# Altium schematic symbol library jlcpcb_2025_04_inductors_extended_0805.schlib: 882 symbols (part 3 of 5)
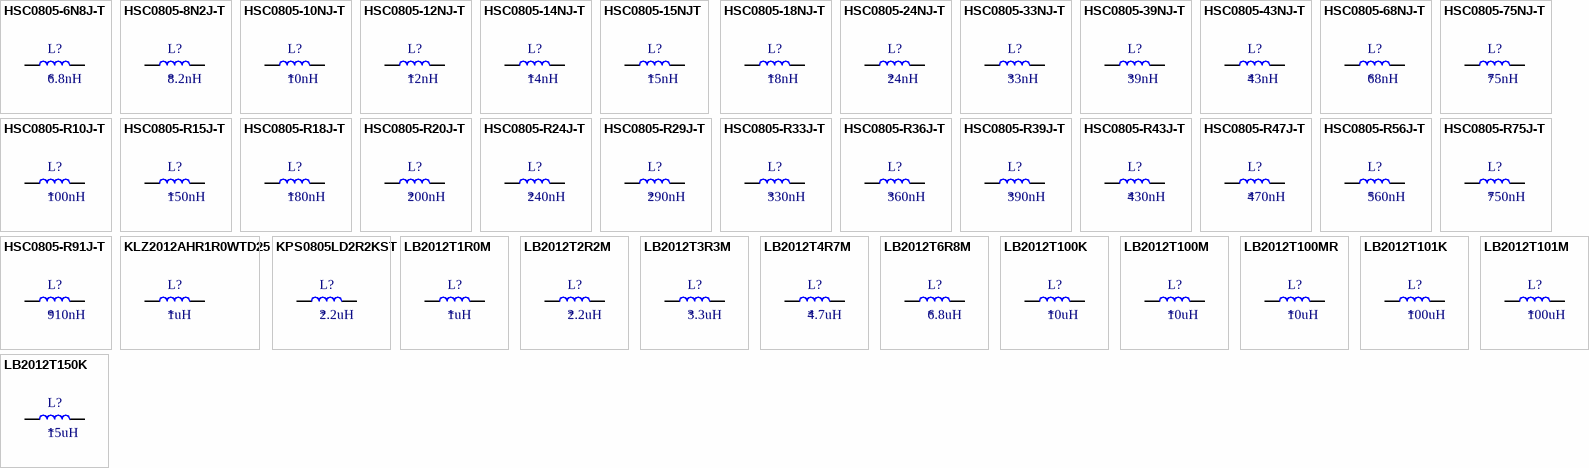
[diagram p24: symbols HSC0805-6N8J-T to LB2012T150K]

## HSC0805-R18J-T
designator L?  Inductance: 180nH
Inductor, 180nH, ±5%, 640mΩ, 400mA, SMD 0805; Manufacturer: EMTEK; Manufacturer Part Number: HSC0805-R18J-T; Self-Resonant Frequency: 870MHz; Q Factor: 50@250MHz; Package Size: 0805; JLCPCB Basic Part: No; JLCPCB Part Number: C251836; Supplier 1: LCSC; Category: Inductors; Supplier Part Number 1: C251836; Tolerance: ±5%; Rated Current: 400mA; DC Resistance: 640mΩ; RoHS: Yes; ComponentLink1Description: Datasheet; ComponentLink1URL: https://wmsc.lcsc.com/wmsc/upload/file/pdf/v2/lcsc/2304140030_EMTEK-HSC0805-R18J-T_C251836.pdf; ComponentLink2Description: JLCPCB Part URL; ComponentLink2URL: https://jlcpcb.com/partdetail/C251836; ComponentLink3Description: LCSC Part URL; ComponentLink3URL: https://lcsc.com/product-detail/Inductors-SMD_EMTEK-EMTEK-HSC0805-R18J-T_C251836.html
footprint IND-0805 (0805 (2012M) Inductor)
pins: 1, 2

## HSC0805-R20J-T
designator L?  Inductance: 200nH
Inductor, 200nH, ±5%, 680mΩ, 400mA, SMD 0805; Manufacturer: EMTEK; Manufacturer Part Number: HSC0805-R20J-T; Self-Resonant Frequency: 865MHz; Q Factor: 50@250MHz; Package Size: 0805; JLCPCB Basic Part: No; JLCPCB Part Number: C251838; Supplier 1: LCSC; Category: Inductors; Supplier Part Number 1: C251838; Tolerance: ±5%; Rated Current: 400mA; DC Resistance: 680mΩ; RoHS: Yes; ComponentLink1Description: Datasheet; ComponentLink1URL: https://wmsc.lcsc.com/wmsc/upload/file/pdf/v2/lcsc/2304140030_EMTEK-HSC0805-R20J-T_C251838.pdf; ComponentLink2Description: JLCPCB Part URL; ComponentLink2URL: https://jlcpcb.com/partdetail/C251838; ComponentLink3Description: LCSC Part URL; ComponentLink3URL: https://lcsc.com/product-detail/Inductors-SMD_EMTEK-EMTEK-HSC0805-R20J-T_C251838.html
footprint IND-0805 (0805 (2012M) Inductor)
pins: 1, 2

## HSC0805-R24J-T
designator L?  Inductance: 240nH
Inductor, 240nH, ±5%, 1Ω, 350mA, SMD 0805; Manufacturer: EMTEK; Manufacturer Part Number: HSC0805-R24J-T; Self-Resonant Frequency: 690MHz; Q Factor: 44@250MHz; Package Size: 0805; JLCPCB Basic Part: No; JLCPCB Part Number: C251864; Supplier 1: LCSC; Category: Inductors; Supplier Part Number 1: C251864; Tolerance: ±5%; Rated Current: 350mA; DC Resistance: 1Ω; RoHS: Yes; ComponentLink1Description: Datasheet; ComponentLink1URL: https://wmsc.lcsc.com/wmsc/upload/file/pdf/v2/lcsc/2304140030_EMTEK-HSC0805-R24J-T_C251864.pdf; ComponentLink2Description: JLCPCB Part URL; ComponentLink2URL: https://jlcpcb.com/partdetail/C251864; ComponentLink3Description: LCSC Part URL; ComponentLink3URL: https://lcsc.com/product-detail/Inductors-SMD_EMTEK-EMTEK-HSC0805-R24J-T_C251864.html
footprint IND-0805 (0805 (2012M) Inductor)
pins: 1, 2

## HSC0805-R29J-T
designator L?  Inductance: 290nH
Inductor, 290nH, ±5%, SMD 0805; Manufacturer: EMTEK; Manufacturer Part Number: HSC0805-R29J-T; Package Size: 0805; JLCPCB Basic Part: No; JLCPCB Part Number: C691872; Supplier 1: LCSC; Category: Inductors; Supplier Part Number 1: C691872; Tolerance: ±5%; RoHS: Yes; ComponentLink1Description: Datasheet; ComponentLink2Description: JLCPCB Part URL; ComponentLink2URL: https://jlcpcb.com/partdetail/C691872; ComponentLink3Description: LCSC Part URL; ComponentLink3URL: https://lcsc.com/product-detail/Inductors-SMD_EMTEK-EMTEK-HSC0805-R29J-T_C691872.html
footprint IND-0805 (0805 (2012M) Inductor)
pins: 1, 2

## HSC0805-R33J-T
designator L?  Inductance: 330nH
Inductor, 330nH, ±5%, 1.4Ω, 310mA, SMD 0805; Manufacturer: EMTEK; Manufacturer Part Number: HSC0805-R33J-T; Self-Resonant Frequency: 750MHz; Q Factor: 48@250MHz; Package Size: 0805; JLCPCB Basic Part: No; JLCPCB Part Number: C251840; Supplier 1: LCSC; Category: Inductors; Supplier Part Number 1: C251840; Tolerance: ±5%; Rated Current: 310mA; DC Resistance: 1.4Ω; RoHS: Yes; ComponentLink1Description: Datasheet; ComponentLink1URL: https://wmsc.lcsc.com/wmsc/upload/file/pdf/v2/lcsc/2304140030_EMTEK-HSC0805-R33J-T_C251840.pdf; ComponentLink2Description: JLCPCB Part URL; ComponentLink2URL: https://jlcpcb.com/partdetail/C251840; ComponentLink3Description: LCSC Part URL; ComponentLink3URL: https://lcsc.com/product-detail/Inductors-SMD_EMTEK-EMTEK-HSC0805-R33J-T_C251840.html
footprint IND-0805 (0805 (2012M) Inductor)
pins: 1, 2

## HSC0805-R36J-T
designator L?  Inductance: 360nH
Inductor, 360nH, ±5%, 1.45Ω, 300mA, SMD 0805; Manufacturer: EMTEK; Manufacturer Part Number: HSC0805-R36J-T; Self-Resonant Frequency: 650MHz; Q Factor: 48@250MHz; Package Size: 0805; JLCPCB Basic Part: No; JLCPCB Part Number: C251841; Supplier 1: LCSC; Category: Inductors; Supplier Part Number 1: C251841; Tolerance: ±5%; Rated Current: 300mA; DC Resistance: 1.45Ω; RoHS: Yes; ComponentLink1Description: Datasheet; ComponentLink1URL: https://wmsc.lcsc.com/wmsc/upload/file/pdf/v2/lcsc/2304140030_EMTEK-HSC0805-R36J-T_C251841.pdf; ComponentLink2Description: JLCPCB Part URL; ComponentLink2URL: https://jlcpcb.com/partdetail/C251841; ComponentLink3Description: LCSC Part URL; ComponentLink3URL: https://lcsc.com/product-detail/Inductors-SMD_EMTEK-EMTEK-HSC0805-R36J-T_C251841.html
footprint IND-0805 (0805 (2012M) Inductor)
pins: 1, 2

## HSC0805-R39J-T
designator L?  Inductance: 390nH
Inductor, 390nH, ±5%, 1.5Ω, 290mA, SMD 0805; Manufacturer: EMTEK; Manufacturer Part Number: HSC0805-R39J-T; Self-Resonant Frequency: 560MHz; Q Factor: 48@250MHz; Package Size: 0805; JLCPCB Basic Part: No; JLCPCB Part Number: C251842; Supplier 1: LCSC; Category: Inductors; Supplier Part Number 1: C251842; Tolerance: ±5%; Rated Current: 290mA; DC Resistance: 1.5Ω; RoHS: Yes; ComponentLink1Description: Datasheet; ComponentLink1URL: https://wmsc.lcsc.com/wmsc/upload/file/pdf/v2/lcsc/2304140030_EMTEK-HSC0805-R39J-T_C251842.pdf; ComponentLink2Description: JLCPCB Part URL; ComponentLink2URL: https://jlcpcb.com/partdetail/C251842; ComponentLink3Description: LCSC Part URL; ComponentLink3URL: https://lcsc.com/product-detail/Inductors-SMD_EMTEK-EMTEK-HSC0805-R39J-T_C251842.html
footprint IND-0805 (0805 (2012M) Inductor)
pins: 1, 2

## HSC0805-R43J-T
designator L?  Inductance: 430nH
Inductor, 430nH, ±5%, 1.7Ω, 270mA, SMD 0805; Manufacturer: EMTEK; Manufacturer Part Number: HSC0805-R43J-T; Self-Resonant Frequency: 430MHz; Q Factor: 33@100MHz; Package Size: 0805; JLCPCB Basic Part: No; JLCPCB Part Number: C251843; Supplier 1: LCSC; Category: Inductors; Supplier Part Number 1: C251843; Tolerance: ±5%; Rated Current: 270mA; DC Resistance: 1.7Ω; RoHS: Yes; ComponentLink1Description: Datasheet; ComponentLink1URL: https://wmsc.lcsc.com/wmsc/upload/file/pdf/v2/lcsc/2304140030_EMTEK-HSC0805-R43J-T_C251843.pdf; ComponentLink2Description: JLCPCB Part URL; ComponentLink2URL: https://jlcpcb.com/partdetail/C251843; ComponentLink3Description: LCSC Part URL; ComponentLink3URL: https://lcsc.com/product-detail/Inductors-SMD_EMTEK-EMTEK-HSC0805-R43J-T_C251843.html
footprint IND-0805 (0805 (2012M) Inductor)
pins: 1, 2

## HSC0805-R47J-T
designator L?  Inductance: 470nH
Inductor, 470nH, ±5%, 1.76Ω, 250mA, SMD 0805; Manufacturer: EMTEK; Manufacturer Part Number: HSC0805-R47J-T; Self-Resonant Frequency: 375MHz; Q Factor: 30@100MHz; Package Size: 0805; JLCPCB Basic Part: No; JLCPCB Part Number: C251844; Supplier 1: LCSC; Category: Inductors; Supplier Part Number 1: C251844; Tolerance: ±5%; Rated Current: 250mA; DC Resistance: 1.76Ω; RoHS: Yes; ComponentLink1Description: Datasheet; ComponentLink1URL: https://wmsc.lcsc.com/wmsc/upload/file/pdf/v2/lcsc/2304140030_EMTEK-HSC0805-R47J-T_C251844.pdf; ComponentLink2Description: JLCPCB Part URL; ComponentLink2URL: https://jlcpcb.com/partdetail/C251844; ComponentLink3Description: LCSC Part URL; ComponentLink3URL: https://lcsc.com/product-detail/Inductors-SMD_EMTEK-EMTEK-HSC0805-R47J-T_C251844.html
footprint IND-0805 (0805 (2012M) Inductor)
pins: 1, 2

## HSC0805-R56J-T
designator L?  Inductance: 560nH
Inductor, 560nH, ±5%, 1.9Ω, 230mA, SMD 0805; Manufacturer: EMTEK; Manufacturer Part Number: HSC0805-R56J-T; Self-Resonant Frequency: 340MHz; Q Factor: 23@50MHz; Package Size: 0805; JLCPCB Basic Part: No; JLCPCB Part Number: C251845; Supplier 1: LCSC; Category: Inductors; Supplier Part Number 1: C251845; Tolerance: ±5%; Rated Current: 230mA; DC Resistance: 1.9Ω; RoHS: Yes; ComponentLink1Description: Datasheet; ComponentLink1URL: https://wmsc.lcsc.com/wmsc/upload/file/pdf/v2/lcsc/2304140030_EMTEK-HSC0805-R56J-T_C251845.pdf; ComponentLink2Description: JLCPCB Part URL; ComponentLink2URL: https://jlcpcb.com/partdetail/C251845; ComponentLink3Description: LCSC Part URL; ComponentLink3URL: https://lcsc.com/product-detail/Inductors-SMD_EMTEK-EMTEK-HSC0805-R56J-T_C251845.html
footprint IND-0805 (0805 (2012M) Inductor)
pins: 1, 2

## HSC0805-R75J-T
designator L?  Inductance: 750nH
Inductor, 750nH, ±5%, 2.3Ω, 180mA, SMD 0805; Manufacturer: EMTEK; Manufacturer Part Number: HSC0805-R75J-T; Self-Resonant Frequency: 200MHz; Q Factor: 23@50MHz; Package Size: 0805; JLCPCB Basic Part: No; JLCPCB Part Number: C251847; Supplier 1: LCSC; Category: Inductors; Supplier Part Number 1: C251847; Tolerance: ±5%; Rated Current: 180mA; DC Resistance: 2.3Ω; RoHS: Yes; ComponentLink1Description: Datasheet; ComponentLink1URL: https://wmsc.lcsc.com/wmsc/upload/file/pdf/v2/lcsc/2304140030_EMTEK-HSC0805-R75J-T_C251847.pdf; ComponentLink2Description: JLCPCB Part URL; ComponentLink2URL: https://jlcpcb.com/partdetail/C251847; ComponentLink3Description: LCSC Part URL; ComponentLink3URL: https://lcsc.com/product-detail/Inductors-SMD_EMTEK-EMTEK-HSC0805-R75J-T_C251847.html
footprint IND-0805 (0805 (2012M) Inductor)
pins: 1, 2

## HSC0805-R91J-T
designator L?  Inductance: 910nH
Inductor, 910nH, ±5%, 2.4Ω, 180mA, SMD 0805; Manufacturer: EMTEK; Manufacturer Part Number: HSC0805-R91J-T; Self-Resonant Frequency: 210MHz; Q Factor: 22@50MHz; Package Size: 0805; JLCPCB Basic Part: No; JLCPCB Part Number: C251861; Supplier 1: LCSC; Category: Inductors; Supplier Part Number 1: C251861; Tolerance: ±5%; Rated Current: 180mA; DC Resistance: 2.4Ω; RoHS: Yes; ComponentLink1Description: Datasheet; ComponentLink1URL: https://wmsc.lcsc.com/wmsc/upload/file/pdf/v2/lcsc/2304140030_EMTEK-HSC0805-R91J-T_C251861.pdf; ComponentLink2Description: JLCPCB Part URL; ComponentLink2URL: https://jlcpcb.com/partdetail/C251861; ComponentLink3Description: LCSC Part URL; ComponentLink3URL: https://lcsc.com/product-detail/Inductors-SMD_EMTEK-EMTEK-HSC0805-R91J-T_C251861.html
footprint IND-0805 (0805 (2012M) Inductor)
pins: 1, 2

## KLZ2012AHR1R0WTD25
designator L?  Inductance: 1uH
Inductor, 1uH, ±20%, 100mΩ, 280mA, SMD 0805; Manufacturer: TDK; Manufacturer Part Number: KLZ2012AHR1R0WTD25; Package Size: 0805; JLCPCB Basic Part: No; JLCPCB Part Number: C404389; Supplier 1: LCSC; Category: Inductors; Supplier Part Number 1: C404389; Tolerance: ±20%; Rated Current: 280mA; Saturation Current: 280mA; DC Resistance: 100mΩ; RoHS: Yes; ComponentLink1Description: Datasheet; ComponentLink1URL: https://wmsc.lcsc.com/wmsc/upload/file/pdf/v2/lcsc/2304140030_TDK-KLZ2012AHR1R0WTD25_C404389.pdf; ComponentLink2Description: JLCPCB Part URL; ComponentLink2URL: https://jlcpcb.com/partdetail/C404389; ComponentLink3Description: LCSC Part URL; ComponentLink3URL: https://lcsc.com/product-detail/Inductors-SMD_TDK-TDK-KLZ2012AHR1R0WTD25_C404389.html
footprint IND-0805 (0805 (2012M) Inductor)
pins: 1, 2

## KPS0805LD2R2KST
designator L?  Inductance: 2.2uH
Inductor, 2.2uH, ±10%, 310mΩ, 740mA, SMD 0805; Manufacturer: Yanchuang; Manufacturer Part Number: KPS0805LD2R2KST; Package Size: 0805; JLCPCB Basic Part: No; JLCPCB Part Number: C494719; Supplier 1: LCSC; Category: Inductors; Supplier Part Number 1: C494719; Tolerance: ±10%; Rated Current: 740mA; DC Resistance: 310mΩ; RoHS: Yes; ComponentLink1Description: Datasheet; ComponentLink1URL: https://wmsc.lcsc.com/wmsc/upload/file/pdf/v2/lcsc/2004071209_Yanchuang-KPS0805LD2R2KST_C494719.pdf; ComponentLink2Description: JLCPCB Part URL; ComponentLink2URL: https://jlcpcb.com/partdetail/C494719; ComponentLink3Description: LCSC Part URL; ComponentLink3URL: https://lcsc.com/product-detail/Inductors-SMD_Yanchuang-Yanchuang-KPS0805LD2R2KST_C494719.html
footprint IND-0805 (0805 (2012M) Inductor)
pins: 1, 2

## LB2012T1R0M
designator L?  Inductance: 1uH
Inductor, 1uH, ±20%, 195mΩ, 405mA, SMD 0805; Manufacturer: Taiyo Yuden; Manufacturer Part Number: LB2012T1R0M; Self-Resonant Frequency: 100MHz; Package Size: 0805; JLCPCB Basic Part: No; JLCPCB Part Number: C90322; Supplier 1: LCSC; Category: Inductors; Supplier Part Number 1: C90322; Tolerance: ±20%; Rated Current: 405mA; DC Resistance: 195mΩ; RoHS: Yes; ComponentLink1Description: Datasheet; ComponentLink1URL: https://wmsc.lcsc.com/wmsc/upload/file/pdf/v2/lcsc/2304140030_Taiyo-Yuden-LB2012T1R0M_C90322.pdf; ComponentLink2Description: JLCPCB Part URL; ComponentLink2URL: https://jlcpcb.com/partdetail/C90322; ComponentLink3Description: LCSC Part URL; ComponentLink3URL: https://lcsc.com/product-detail/Inductors-SMD_Taiyo-Yuden-Taiyo-Yuden-LB2012T1R0M_C90322.html
footprint IND-0805 (0805 (2012M) Inductor)
pins: 1, 2

## LB2012T2R2M
designator L?  Inductance: 2.2uH
Inductor, 2.2uH, ±20%, 230mΩ, 260mA, SMD 0805; Manufacturer: Taiyo Yuden; Manufacturer Part Number: LB2012T2R2M; Self-Resonant Frequency: 7.96MHz; Package Size: 0805; JLCPCB Basic Part: No; JLCPCB Part Number: C90323; Supplier 1: LCSC; Category: Inductors; Supplier Part Number 1: C90323; Tolerance: ±20%; Rated Current: 260mA; DC Resistance: 230mΩ; RoHS: Yes; ComponentLink1Description: Datasheet; ComponentLink1URL: https://wmsc.lcsc.com/wmsc/upload/file/pdf/v2/lcsc/2304140030_Taiyo-Yuden-LB2012T2R2M_C90323.pdf; ComponentLink2Description: JLCPCB Part URL; ComponentLink2URL: https://jlcpcb.com/partdetail/C90323; ComponentLink3Description: LCSC Part URL; ComponentLink3URL: https://lcsc.com/product-detail/Inductors-SMD_Taiyo-Yuden-Taiyo-Yuden-LB2012T2R2M_C90323.html
footprint IND-0805 (0805 (2012M) Inductor)
pins: 1, 2

## LB2012T3R3M
designator L?  Inductance: 3.3uH
Inductor, 3.3uH, ±20%, 300mΩ, 235mA, SMD 0805; Manufacturer: Taiyo Yuden; Manufacturer Part Number: LB2012T3R3M; Self-Resonant Frequency: 7.96MHz; Package Size: 0805; JLCPCB Basic Part: No; JLCPCB Part Number: C223246; Supplier 1: LCSC; Category: Inductors; Supplier Part Number 1: C223246; Tolerance: ±20%; Rated Current: 235mA; DC Resistance: 300mΩ; RoHS: Yes; ComponentLink1Description: Datasheet; ComponentLink1URL: https://wmsc.lcsc.com/wmsc/upload/file/pdf/v2/lcsc/2304140030_Taiyo-Yuden-LB2012T3R3M_C223246.pdf; ComponentLink2Description: JLCPCB Part URL; ComponentLink2URL: https://jlcpcb.com/partdetail/C223246; ComponentLink3Description: LCSC Part URL; ComponentLink3URL: https://lcsc.com/product-detail/Inductors-SMD_Taiyo-Yuden-Taiyo-Yuden-LB2012T3R3M_C223246.html
footprint IND-0805 (0805 (2012M) Inductor)
pins: 1, 2

## LB2012T4R7M
designator L?  Inductance: 4.7uH
Inductor, 4.7uH, ±20%, 400mΩ, 190mA, SMD 0805; Manufacturer: Taiyo Yuden; Manufacturer Part Number: LB2012T4R7M; Self-Resonant Frequency: 7.96MHz; Package Size: 0805; JLCPCB Basic Part: No; JLCPCB Part Number: C90324; Supplier 1: LCSC; Category: Inductors; Supplier Part Number 1: C90324; Tolerance: ±20%; Rated Current: 190mA; DC Resistance: 400mΩ; RoHS: Yes; ComponentLink1Description: Datasheet; ComponentLink1URL: https://wmsc.lcsc.com/wmsc/upload/file/pdf/v2/lcsc/2304140030_Taiyo-Yuden-LB2012T4R7M_C90324.pdf; ComponentLink2Description: JLCPCB Part URL; ComponentLink2URL: https://jlcpcb.com/partdetail/C90324; ComponentLink3Description: LCSC Part URL; ComponentLink3URL: https://lcsc.com/product-detail/Inductors-SMD_Taiyo-Yuden-Taiyo-Yuden-LB2012T4R7M_C90324.html
footprint IND-0805 (0805 (2012M) Inductor)
pins: 1, 2

## LB2012T6R8M
designator L?  Inductance: 6.8uH
Inductor, 6.8uH, ±20%, 470mΩ, 135mA, SMD 0805; Manufacturer: Taiyo Yuden; Manufacturer Part Number: LB2012T6R8M; Package Size: 0805; JLCPCB Basic Part: No; JLCPCB Part Number: C223247; Supplier 1: LCSC; Category: Inductors; Supplier Part Number 1: C223247; Tolerance: ±20%; Rated Current: 135mA; DC Resistance: 470mΩ; RoHS: Yes; ComponentLink1Description: Datasheet; ComponentLink1URL: https://wmsc.lcsc.com/wmsc/upload/file/pdf/v2/lcsc/2304140030_Taiyo-Yuden-LB2012T6R8M_C223247.pdf; ComponentLink2Description: JLCPCB Part URL; ComponentLink2URL: https://jlcpcb.com/partdetail/C223247; ComponentLink3Description: LCSC Part URL; ComponentLink3URL: https://lcsc.com/product-detail/Inductors-SMD_Taiyo-Yuden-Taiyo-Yuden-LB2012T6R8M_C223247.html
footprint IND-0805 (0805 (2012M) Inductor)
pins: 1, 2

## LB2012T100K
designator L?  Inductance: 10uH
Inductor, 10uH, ±10%, 700mΩ, 120mA, SMD 0805; Manufacturer: Taiyo Yuden; Manufacturer Part Number: LB2012T100K; Self-Resonant Frequency: 2.52MHz; Package Size: 0805; JLCPCB Basic Part: No; JLCPCB Part Number: C223249; Supplier 1: LCSC; Category: Inductors; Supplier Part Number 1: C223249; Tolerance: ±10%; Rated Current: 120mA; DC Resistance: 700mΩ; RoHS: Yes; ComponentLink1Description: Datasheet; ComponentLink1URL: https://wmsc.lcsc.com/wmsc/upload/file/pdf/v2/lcsc/2304140030_Taiyo-Yuden-LB2012T100K_C223249.pdf; ComponentLink2Description: JLCPCB Part URL; ComponentLink2URL: https://jlcpcb.com/partdetail/C223249; ComponentLink3Description: LCSC Part URL; ComponentLink3URL: https://lcsc.com/product-detail/Inductors-SMD_Taiyo-Yuden-Taiyo-Yuden-LB2012T100K_C223249.html
footprint IND-0805 (0805 (2012M) Inductor)
pins: 1, 2

## LB2012T100M
designator L?  Inductance: 10uH
Inductor, 10uH, ±20%, 700mΩ, 120mA, SMD 0805; Manufacturer: Taiyo Yuden; Manufacturer Part Number: LB2012T100M; Package Size: 0805; JLCPCB Basic Part: No; JLCPCB Part Number: C223248; Supplier 1: LCSC; Category: Inductors; Supplier Part Number 1: C223248; Tolerance: ±20%; Rated Current: 120mA; DC Resistance: 700mΩ; RoHS: Yes; ComponentLink1Description: Datasheet; ComponentLink1URL: https://wmsc.lcsc.com/wmsc/upload/file/pdf/v2/lcsc/2304140030_Taiyo-Yuden-LB2012T100M_C223248.pdf; ComponentLink2Description: JLCPCB Part URL; ComponentLink2URL: https://jlcpcb.com/partdetail/C223248; ComponentLink3Description: LCSC Part URL; ComponentLink3URL: https://lcsc.com/product-detail/Inductors-SMD_Taiyo-Yuden-Taiyo-Yuden-LB2012T100M_C223248.html
footprint IND-0805 (0805 (2012M) Inductor)
pins: 1, 2

## LB2012T100MR
designator L?  Inductance: 10uH
Inductor, 10uH, ±20%, 500mΩ, 120mA, SMD 0805; Manufacturer: Taiyo Yuden; Manufacturer Part Number: LB2012T100MR; Self-Resonant Frequency: 2.52MHz; Package Size: 0805; JLCPCB Basic Part: No; JLCPCB Part Number: C223250; Supplier 1: LCSC; Category: Inductors; Supplier Part Number 1: C223250; Tolerance: ±20%; Rated Current: 120mA; DC Resistance: 500mΩ; RoHS: Yes; ComponentLink1Description: Datasheet; ComponentLink1URL: https://wmsc.lcsc.com/wmsc/upload/file/pdf/v2/lcsc/2304140030_Taiyo-Yuden-LB2012T100MR_C223250.pdf; ComponentLink2Description: JLCPCB Part URL; ComponentLink2URL: https://jlcpcb.com/partdetail/C223250; ComponentLink3Description: LCSC Part URL; ComponentLink3URL: https://lcsc.com/product-detail/Inductors-SMD_Taiyo-Yuden-Taiyo-Yuden-LB2012T100MR_C223250.html
footprint IND-0805 (0805 (2012M) Inductor)
pins: 1, 2

## LB2012T101K
designator L?  Inductance: 100uH
Inductor, 100uH, ±10%, 9.1Ω, 45mA, SMD 0805; Manufacturer: Taiyo Yuden; Manufacturer Part Number: LB2012T101K; Self-Resonant Frequency: 8MHz; Package Size: 0805; JLCPCB Basic Part: No; JLCPCB Part Number: C92907; Supplier 1: LCSC; Category: Inductors; Supplier Part Number 1: C92907; Tolerance: ±10%; Rated Current: 45mA; DC Resistance: 9.1Ω; RoHS: Yes; ComponentLink1Description: Datasheet; ComponentLink1URL: https://wmsc.lcsc.com/wmsc/upload/file/pdf/v2/lcsc/1810091458_Taiyo-Yuden-LB2012T101K_C92907.pdf; ComponentLink2Description: JLCPCB Part URL; ComponentLink2URL: https://jlcpcb.com/partdetail/C92907; ComponentLink3Description: LCSC Part URL; ComponentLink3URL: https://lcsc.com/product-detail/Inductors-SMD_Taiyo-Yuden-Taiyo-Yuden-LB2012T101K_C92907.html
footprint IND-0805 (0805 (2012M) Inductor)
pins: 1, 2

## LB2012T101M
designator L?  Inductance: 100uH
Inductor, 100uH, ±20%, 7Ω, 45mA, SMD 0805; Manufacturer: Taiyo Yuden; Manufacturer Part Number: LB2012T101M; Self-Resonant Frequency: 796kHz; Package Size: 0805; JLCPCB Basic Part: No; JLCPCB Part Number: C223258; Supplier 1: LCSC; Category: Inductors; Supplier Part Number 1: C223258; Tolerance: ±20%; Rated Current: 45mA; DC Resistance: 7Ω; RoHS: Yes; ComponentLink1Description: Datasheet; ComponentLink1URL: https://wmsc.lcsc.com/wmsc/upload/file/pdf/v2/lcsc/2304140030_Taiyo-Yuden-LB2012T101M_C223258.pdf; ComponentLink2Description: JLCPCB Part URL; ComponentLink2URL: https://jlcpcb.com/partdetail/C223258; ComponentLink3Description: LCSC Part URL; ComponentLink3URL: https://lcsc.com/product-detail/Inductors-SMD_Taiyo-Yuden-Taiyo-Yuden-LB2012T101M_C223258.html
footprint IND-0805 (0805 (2012M) Inductor)
pins: 1, 2

## LB2012T150K
designator L?  Inductance: 15uH
Inductor, 15uH, ±10%, 1.69Ω, 100mA, SMD 0805; Manufacturer: Taiyo Yuden; Manufacturer Part Number: LB2012T150K; Package Size: 0805; JLCPCB Basic Part: No; JLCPCB Part Number: C92908; Supplier 1: LCSC; Category: Inductors; Supplier Part Number 1: C92908; Tolerance: ±10%; Rated Current: 100mA; DC Resistance: 1.69Ω; RoHS: Yes; ComponentLink1Description: Datasheet; ComponentLink1URL: https://wmsc.lcsc.com/wmsc/upload/file/pdf/v2/lcsc/1810091421_Taiyo-Yuden-LB2012T150K_C92908.pdf; ComponentLink2Description: JLCPCB Part URL; ComponentLink2URL: https://jlcpcb.com/partdetail/C92908; ComponentLink3Description: LCSC Part URL; ComponentLink3URL: https://lcsc.com/product-detail/Inductors-SMD_Taiyo-Yuden-Taiyo-Yuden-LB2012T150K_C92908.html
footprint IND-0805 (0805 (2012M) Inductor)
pins: 1, 2

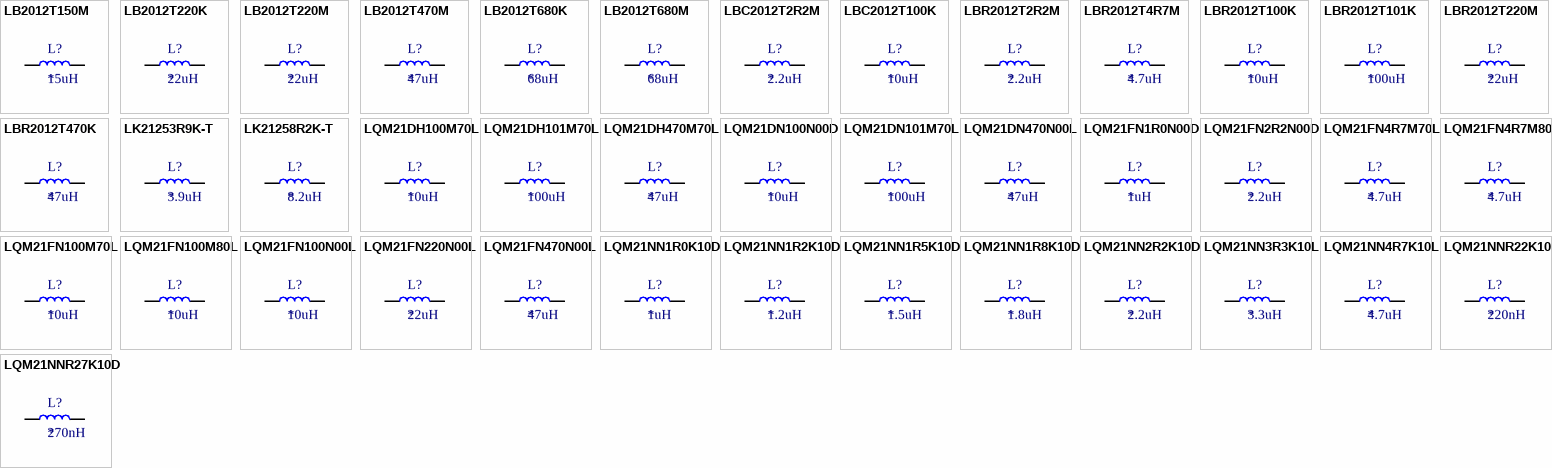
[diagram p10: symbols LB2012T150M to LQM21NNR27K10D]

## LB2012T150M
designator L?  Inductance: 15uH
Inductor, 15uH, ±20%, 1.3Ω, 100mA, SMD 0805; Manufacturer: Taiyo Yuden; Manufacturer Part Number: LB2012T150M; Package Size: 0805; JLCPCB Basic Part: No; JLCPCB Part Number: C223251; Supplier 1: LCSC; Category: Inductors; Supplier Part Number 1: C223251; Tolerance: ±20%; Rated Current: 100mA; DC Resistance: 1.3Ω; RoHS: Yes; ComponentLink1Description: Datasheet; ComponentLink1URL: https://wmsc.lcsc.com/wmsc/upload/file/pdf/v2/lcsc/2304140030_Taiyo-Yuden-LB2012T150M_C223251.pdf; ComponentLink2Description: JLCPCB Part URL; ComponentLink2URL: https://jlcpcb.com/partdetail/C223251; ComponentLink3Description: LCSC Part URL; ComponentLink3URL: https://lcsc.com/product-detail/Inductors-SMD_Taiyo-Yuden-Taiyo-Yuden-LB2012T150M_C223251.html
footprint IND-0805 (0805 (2012M) Inductor)
pins: 1, 2

## LB2012T220K
designator L?  Inductance: 22uH
Inductor, 22uH, ±10%, 2.21Ω, 80mA, SMD 0805; Manufacturer: Taiyo Yuden; Manufacturer Part Number: LB2012T220K; Package Size: 0805; JLCPCB Basic Part: No; JLCPCB Part Number: C223253; Supplier 1: LCSC; Category: Inductors; Supplier Part Number 1: C223253; Tolerance: ±10%; Rated Current: 80mA; DC Resistance: 2.21Ω; RoHS: Yes; ComponentLink1Description: Datasheet; ComponentLink1URL: https://wmsc.lcsc.com/wmsc/upload/file/pdf/v2/lcsc/1810091458_Taiyo-Yuden-LB2012T220K_C223253.pdf; ComponentLink2Description: JLCPCB Part URL; ComponentLink2URL: https://jlcpcb.com/partdetail/C223253; ComponentLink3Description: LCSC Part URL; ComponentLink3URL: https://lcsc.com/product-detail/Inductors-SMD_Taiyo-Yuden-Taiyo-Yuden-LB2012T220K_C223253.html
footprint IND-0805 (0805 (2012M) Inductor)
pins: 1, 2

## LB2012T220M
designator L?  Inductance: 22uH
Inductor, 22uH, ±20%, 1.7Ω, 80mA, SMD 0805; Manufacturer: Taiyo Yuden; Manufacturer Part Number: LB2012T220M; Package Size: 0805; JLCPCB Basic Part: No; JLCPCB Part Number: C223252; Supplier 1: LCSC; Category: Inductors; Supplier Part Number 1: C223252; Tolerance: ±20%; Rated Current: 80mA; DC Resistance: 1.7Ω; RoHS: Yes; ComponentLink1Description: Datasheet; ComponentLink1URL: https://wmsc.lcsc.com/wmsc/upload/file/pdf/v2/lcsc/2304140030_Taiyo-Yuden-LB2012T220M_C223252.pdf; ComponentLink2Description: JLCPCB Part URL; ComponentLink2URL: https://jlcpcb.com/partdetail/C223252; ComponentLink3Description: LCSC Part URL; ComponentLink3URL: https://lcsc.com/product-detail/Inductors-SMD_Taiyo-Yuden-Taiyo-Yuden-LB2012T220M_C223252.html
footprint IND-0805 (0805 (2012M) Inductor)
pins: 1, 2

## LB2012T470M
designator L?  Inductance: 47uH
Inductor, 47uH, ±20%, 3.7Ω, 60mA, SMD 0805; Manufacturer: Taiyo Yuden; Manufacturer Part Number: LB2012T470M; Self-Resonant Frequency: 2.52MHz; Package Size: 0805; JLCPCB Basic Part: No; JLCPCB Part Number: C223254; Supplier 1: LCSC; Category: Inductors; Supplier Part Number 1: C223254; Tolerance: ±20%; Rated Current: 60mA; DC Resistance: 3.7Ω; RoHS: Yes; ComponentLink1Description: Datasheet; ComponentLink1URL: https://wmsc.lcsc.com/wmsc/upload/file/pdf/v2/lcsc/2304140030_Taiyo-Yuden-LB2012T470M_C223254.pdf; ComponentLink2Description: JLCPCB Part URL; ComponentLink2URL: https://jlcpcb.com/partdetail/C223254; ComponentLink3Description: LCSC Part URL; ComponentLink3URL: https://lcsc.com/product-detail/Inductors-SMD_Taiyo-Yuden-Taiyo-Yuden-LB2012T470M_C223254.html
footprint IND-0805 (0805 (2012M) Inductor)
pins: 1, 2

## LB2012T680K
designator L?  Inductance: 68uH
Inductor, 68uH, ±10%, 6Ω, 50mA, SMD 0805; Manufacturer: Taiyo Yuden; Manufacturer Part Number: LB2012T680K; Self-Resonant Frequency: 2.52MHz; Package Size: 0805; JLCPCB Basic Part: No; JLCPCB Part Number: C223257; Supplier 1: LCSC; Category: Inductors; Supplier Part Number 1: C223257; Tolerance: ±10%; Rated Current: 50mA; DC Resistance: 6Ω; RoHS: Yes; ComponentLink1Description: Datasheet; ComponentLink1URL: https://wmsc.lcsc.com/wmsc/upload/file/pdf/v2/lcsc/2304140030_Taiyo-Yuden-LB2012T680K_C223257.pdf; ComponentLink2Description: JLCPCB Part URL; ComponentLink2URL: https://jlcpcb.com/partdetail/C223257; ComponentLink3Description: LCSC Part URL; ComponentLink3URL: https://lcsc.com/product-detail/Inductors-SMD_Taiyo-Yuden-Taiyo-Yuden-LB2012T680K_C223257.html
footprint IND-0805 (0805 (2012M) Inductor)
pins: 1, 2

## LB2012T680M
designator L?  Inductance: 68uH
Inductor, 68uH, ±20%, 6Ω, 50mA, SMD 0805; Manufacturer: Taiyo Yuden; Manufacturer Part Number: LB2012T680M; Package Size: 0805; JLCPCB Basic Part: No; JLCPCB Part Number: C223256; Supplier 1: LCSC; Category: Inductors; Supplier Part Number 1: C223256; Tolerance: ±20%; Rated Current: 50mA; DC Resistance: 6Ω; RoHS: Yes; ComponentLink1Description: Datasheet; ComponentLink1URL: https://wmsc.lcsc.com/wmsc/upload/file/pdf/v2/lcsc/2304140030_Taiyo-Yuden-LB2012T680M_C223256.pdf; ComponentLink2Description: JLCPCB Part URL; ComponentLink2URL: https://jlcpcb.com/partdetail/C223256; ComponentLink3Description: LCSC Part URL; ComponentLink3URL: https://lcsc.com/product-detail/Inductors-SMD_Taiyo-Yuden-Taiyo-Yuden-LB2012T680M_C223256.html
footprint IND-0805 (0805 (2012M) Inductor)
pins: 1, 2

## LBC2012T2R2M
designator L?  Inductance: 2.2uH
Inductor, 2.2uH, ±20%, 330mΩ, 430mA, SMD 0805; Manufacturer: Taiyo Yuden; Manufacturer Part Number: LBC2012T2R2M; Package Size: 0805; JLCPCB Basic Part: No; JLCPCB Part Number: C92915; Supplier 1: LCSC; Category: Inductors; Supplier Part Number 1: C92915; Tolerance: ±20%; Rated Current: 430mA; DC Resistance: 330mΩ; RoHS: Yes; ComponentLink1Description: Datasheet; ComponentLink1URL: https://wmsc.lcsc.com/wmsc/upload/file/pdf/v2/lcsc/1810091421_Taiyo-Yuden-LBC2012T2R2M_C92915.pdf; ComponentLink2Description: JLCPCB Part URL; ComponentLink2URL: https://jlcpcb.com/partdetail/C92915; ComponentLink3Description: LCSC Part URL; ComponentLink3URL: https://lcsc.com/product-detail/Inductors-SMD_Taiyo-Yuden-Taiyo-Yuden-LBC2012T2R2M_C92915.html
footprint IND-0805 (0805 (2012M) Inductor)
pins: 1, 2

## LBC2012T100K
designator L?  Inductance: 10uH
Inductor, 10uH, ±10%, 1.2Ω, 200mA, SMD 0805; Manufacturer: Taiyo Yuden; Manufacturer Part Number: LBC2012T100K; Package Size: 0805; JLCPCB Basic Part: No; JLCPCB Part Number: C223261; Supplier 1: LCSC; Category: Inductors; Supplier Part Number 1: C223261; Tolerance: ±10%; Rated Current: 200mA; DC Resistance: 1.2Ω; RoHS: Yes; ComponentLink1Description: Datasheet; ComponentLink1URL: https://wmsc.lcsc.com/wmsc/upload/file/pdf/v2/lcsc/2304140030_Taiyo-Yuden-LBC2012T100K_C223261.pdf; ComponentLink2Description: JLCPCB Part URL; ComponentLink2URL: https://jlcpcb.com/partdetail/C223261; ComponentLink3Description: LCSC Part URL; ComponentLink3URL: https://lcsc.com/product-detail/Inductors-SMD_Taiyo-Yuden-Taiyo-Yuden-LBC2012T100K_C223261.html
footprint IND-0805 (0805 (2012M) Inductor)
pins: 1, 2

## LBR2012T2R2M
designator L?  Inductance: 2.2uH
Inductor, 2.2uH, ±20%, 130mΩ, 260mA, SMD 0805; Manufacturer: Taiyo Yuden; Manufacturer Part Number: LBR2012T2R2M; Package Size: 0805; JLCPCB Basic Part: No; JLCPCB Part Number: C223266; Supplier 1: LCSC; Category: Inductors; Supplier Part Number 1: C223266; Tolerance: ±20%; Rated Current: 260mA; DC Resistance: 130mΩ; RoHS: Yes; ComponentLink1Description: Datasheet; ComponentLink1URL: https://wmsc.lcsc.com/wmsc/upload/file/pdf/v2/lcsc/2304140030_Taiyo-Yuden-LBR2012T2R2M_C223266.pdf; ComponentLink2Description: JLCPCB Part URL; ComponentLink2URL: https://jlcpcb.com/partdetail/C223266; ComponentLink3Description: LCSC Part URL; ComponentLink3URL: https://lcsc.com/product-detail/Inductors-SMD_Taiyo-Yuden-Taiyo-Yuden-LBR2012T2R2M_C223266.html
footprint IND-0805 (0805 (2012M) Inductor)
pins: 1, 2

## LBR2012T4R7M
designator L?  Inductance: 4.7uH
Inductor, 4.7uH, ±20%, 312mΩ, 200mA, SMD 0805; Manufacturer: Taiyo Yuden; Manufacturer Part Number: LBR2012T4R7M; Package Size: 0805; JLCPCB Basic Part: No; JLCPCB Part Number: C223267; Supplier 1: LCSC; Category: Inductors; Supplier Part Number 1: C223267; Tolerance: ±20%; Rated Current: 200mA; DC Resistance: 312mΩ; RoHS: Yes; ComponentLink1Description: Datasheet; ComponentLink1URL: https://wmsc.lcsc.com/wmsc/upload/file/pdf/v2/lcsc/1808280450_Taiyo-Yuden-LBR2012T4R7M_C223267.pdf; ComponentLink2Description: JLCPCB Part URL; ComponentLink2URL: https://jlcpcb.com/partdetail/C223267; ComponentLink3Description: LCSC Part URL; ComponentLink3URL: https://lcsc.com/product-detail/Inductors-SMD_Taiyo-Yuden-Taiyo-Yuden-LBR2012T4R7M_C223267.html
footprint IND-0805 (0805 (2012M) Inductor)
pins: 1, 2

## LBR2012T100K
designator L?  Inductance: 10uH
Inductor, 10uH, ±10%, 468mΩ, 150mA, SMD 0805; Manufacturer: Taiyo Yuden; Manufacturer Part Number: LBR2012T100K; Self-Resonant Frequency: 32MHz; Package Size: 0805; JLCPCB Basic Part: No; JLCPCB Part Number: C223269; Supplier 1: LCSC; Category: Inductors; Supplier Part Number 1: C223269; Tolerance: ±10%; Rated Current: 150mA; DC Resistance: 468mΩ; RoHS: Yes; ComponentLink1Description: Datasheet; ComponentLink1URL: https://wmsc.lcsc.com/wmsc/upload/file/pdf/v2/lcsc/1808280424_Taiyo-Yuden-LBR2012T100K_C223269.pdf; ComponentLink2Description: JLCPCB Part URL; ComponentLink2URL: https://jlcpcb.com/partdetail/C223269; ComponentLink3Description: LCSC Part URL; ComponentLink3URL: https://lcsc.com/product-detail/Inductors-SMD_Taiyo-Yuden-Taiyo-Yuden-LBR2012T100K_C223269.html
footprint IND-0805 (0805 (2012M) Inductor)
pins: 1, 2

## LBR2012T101K
designator L?  Inductance: 100uH
Inductor, 100uH, ±10%, 5.2Ω, 50mA, SMD 0805; Manufacturer: Taiyo Yuden; Manufacturer Part Number: LBR2012T101K; Self-Resonant Frequency: 8MHz; Package Size: 0805; JLCPCB Basic Part: No; JLCPCB Part Number: C223274; Supplier 1: LCSC; Category: Inductors; Supplier Part Number 1: C223274; Tolerance: ±10%; Rated Current: 50mA; DC Resistance: 5.2Ω; RoHS: Yes; ComponentLink1Description: Datasheet; ComponentLink1URL: https://wmsc.lcsc.com/wmsc/upload/file/pdf/v2/lcsc/1808280424_Taiyo-Yuden-LBR2012T101K_C223274.pdf; ComponentLink2Description: JLCPCB Part URL; ComponentLink2URL: https://jlcpcb.com/partdetail/C223274; ComponentLink3Description: LCSC Part URL; ComponentLink3URL: https://lcsc.com/product-detail/Inductors-SMD_Taiyo-Yuden-Taiyo-Yuden-LBR2012T101K_C223274.html
footprint IND-0805 (0805 (2012M) Inductor)
pins: 1, 2

## LBR2012T220M
designator L?  Inductance: 22uH
Inductor, 22uH, ±20%, 1Ω, 100mA, SMD 0805; Manufacturer: Taiyo Yuden; Manufacturer Part Number: LBR2012T220M; Self-Resonant Frequency: 2.52MHz; Package Size: 0805; JLCPCB Basic Part: No; JLCPCB Part Number: C223270; Supplier 1: LCSC; Category: Inductors; Supplier Part Number 1: C223270; Tolerance: ±20%; Rated Current: 100mA; DC Resistance: 1Ω; RoHS: Yes; ComponentLink1Description: Datasheet; ComponentLink1URL: https://wmsc.lcsc.com/wmsc/upload/file/pdf/v2/lcsc/1912111437_Taiyo-Yuden-LBR2012T220M_C223270.pdf; ComponentLink2Description: JLCPCB Part URL; ComponentLink2URL: https://jlcpcb.com/partdetail/C223270; ComponentLink3Description: LCSC Part URL; ComponentLink3URL: https://lcsc.com/product-detail/Inductors-SMD_Taiyo-Yuden-Taiyo-Yuden-LBR2012T220M_C223270.html
footprint IND-0805 (0805 (2012M) Inductor)
pins: 1, 2

## LBR2012T470K
designator L?  Inductance: 47uH
Inductor, 47uH, ±10%, 2.21Ω, 75mA, SMD 0805; Manufacturer: Taiyo Yuden; Manufacturer Part Number: LBR2012T470K; Self-Resonant Frequency: 11MHz; Package Size: 0805; JLCPCB Basic Part: No; JLCPCB Part Number: C223272; Supplier 1: LCSC; Category: Inductors; Supplier Part Number 1: C223272; Tolerance: ±10%; Rated Current: 75mA; DC Resistance: 2.21Ω; RoHS: Yes; ComponentLink1Description: Datasheet; ComponentLink1URL: https://wmsc.lcsc.com/wmsc/upload/file/pdf/v2/lcsc/1808280450_Taiyo-Yuden-LBR2012T470K_C223272.pdf; ComponentLink2Description: JLCPCB Part URL; ComponentLink2URL: https://jlcpcb.com/partdetail/C223272; ComponentLink3Description: LCSC Part URL; ComponentLink3URL: https://lcsc.com/product-detail/Inductors-SMD_Taiyo-Yuden-Taiyo-Yuden-LBR2012T470K_C223272.html
footprint IND-0805 (0805 (2012M) Inductor)
pins: 1, 2

## LK21253R9K-T
designator L?  Inductance: 3.9uH
Inductor, 3.9uH, ±10%, 700mΩ, 30mA, SMD 0805; Manufacturer: Taiyo Yuden; Manufacturer Part Number: LK21253R9K-T; Package Size: 0805; JLCPCB Basic Part: No; JLCPCB Part Number: C92920; Supplier 1: LCSC; Category: Inductors; Supplier Part Number 1: C92920; Tolerance: ±10%; Rated Current: 30mA; DC Resistance: 700mΩ; RoHS: Yes; ComponentLink1Description: Datasheet; ComponentLink1URL: https://wmsc.lcsc.com/wmsc/upload/file/pdf/v2/lcsc/1810091422_Taiyo-Yuden-LK21253R9K-T_C92920.pdf; ComponentLink2Description: JLCPCB Part URL; ComponentLink2URL: https://jlcpcb.com/partdetail/C92920; ComponentLink3Description: LCSC Part URL; ComponentLink3URL: https://lcsc.com/product-detail/Inductors-SMD_Taiyo-Yuden-Taiyo-Yuden-LK21253R9K-T_C92920.html
footprint IND-0805 (0805 (2012M) Inductor)
pins: 1, 2

## LK21258R2K-T
designator L?  Inductance: 8.2uH
Inductor, 8.2uH, ±10%, 700mΩ, 15mA, SMD 0805; Manufacturer: Taiyo Yuden; Manufacturer Part Number: LK21258R2K-T; Package Size: 0805; JLCPCB Basic Part: No; JLCPCB Part Number: C13950; Supplier 1: LCSC; Category: Inductors; Supplier Part Number 1: C13950; Tolerance: ±10%; Rated Current: 15mA; DC Resistance: 700mΩ; RoHS: Yes; ComponentLink1Description: Datasheet; ComponentLink1URL: https://wmsc.lcsc.com/wmsc/upload/file/pdf/v2/lcsc/1810091422_Taiyo-Yuden-LK21258R2K-T_C13950.pdf; ComponentLink2Description: JLCPCB Part URL; ComponentLink2URL: https://jlcpcb.com/partdetail/C13950; ComponentLink3Description: LCSC Part URL; ComponentLink3URL: https://lcsc.com/product-detail/Inductors-SMD_Taiyo-Yuden-Taiyo-Yuden-LK21258R2K-T_C13950.html
footprint IND-0805 (0805 (2012M) Inductor)
pins: 1, 2

## LQM21DH100M70L
designator L?  Inductance: 10uH
Inductor, 10uH, ±20%, 845mΩ, 250mA, SMD 0805; Manufacturer: Murata Electronics; Manufacturer Part Number: LQM21DH100M70L; Self-Resonant Frequency: 27MHz; Package Size: 0805; JLCPCB Basic Part: No; JLCPCB Part Number: C882484; Supplier 1: LCSC; Category: Inductors; Supplier Part Number 1: C882484; Tolerance: ±20%; Rated Current: 250mA; Saturation Current: 250mA; DC Resistance: 845mΩ; RoHS: Yes; ComponentLink1Description: Datasheet; ComponentLink1URL: https://wmsc.lcsc.com/wmsc/upload/file/pdf/v2/lcsc/2201242130_Murata-Electronics-LQM21DH100M70L_C882484.pdf; ComponentLink2Description: JLCPCB Part URL; ComponentLink2URL: https://jlcpcb.com/partdetail/C882484; ComponentLink3Description: LCSC Part URL; ComponentLink3URL: https://lcsc.com/product-detail/Inductors-SMD_Murata-Electronics-Murata-Electronics-LQM21DH100M70L_C882484.html
footprint IND-0805 (0805 (2012M) Inductor)
pins: 1, 2

## LQM21DH101M70L
designator L?  Inductance: 100uH
Inductor, 100uH, ±20%, 3.15Ω, 20mA, SMD 0805; Manufacturer: Murata Electronics; Manufacturer Part Number: LQM21DH101M70L; Self-Resonant Frequency: 8MHz; Package Size: 0805; JLCPCB Basic Part: No; JLCPCB Part Number: C1512141; Supplier 1: LCSC; Category: Inductors; Supplier Part Number 1: C1512141; Tolerance: ±20%; Rated Current: 20mA; Saturation Current: 20mA; DC Resistance: 3.15Ω; RoHS: Yes; ComponentLink1Description: Datasheet; ComponentLink1URL: https://wmsc.lcsc.com/wmsc/upload/file/pdf/v2/lcsc/2304140030_Murata-Electronics-LQM21DH101M70L_C1512141.pdf; ComponentLink2Description: JLCPCB Part URL; ComponentLink2URL: https://jlcpcb.com/partdetail/C1512141; ComponentLink3Description: LCSC Part URL; ComponentLink3URL: https://lcsc.com/product-detail/Inductors-SMD_Murata-Electronics-Murata-Electronics-LQM21DH101M70L_C1512141.html
footprint IND-0805 (0805 (2012M) Inductor)
pins: 1, 2

## LQM21DH470M70L
designator L?  Inductance: 47uH
Inductor, 47uH, ±20%, 2.99Ω, SMD 0805; Manufacturer: Murata Electronics; Manufacturer Part Number: LQM21DH470M70L; Saturation Current: 50mA; Self-Resonant Frequency: 12MHz; Package Size: 0805; JLCPCB Basic Part: No; JLCPCB Part Number: C2046325; Supplier 1: LCSC; Category: Inductors; Supplier Part Number 1: C2046325; Tolerance: ±20%; DC Resistance: 2.99Ω; RoHS: Yes; ComponentLink1Description: Datasheet; ComponentLink1URL: https://wmsc.lcsc.com/wmsc/upload/file/pdf/v2/lcsc/2401270820_Murata-Electronics-LQM21DH470M70L_C2046325.pdf; ComponentLink2Description: JLCPCB Part URL; ComponentLink2URL: https://jlcpcb.com/partdetail/C2046325; ComponentLink3Description: LCSC Part URL; ComponentLink3URL: https://lcsc.com/product-detail/Inductors-SMD_Murata-Electronics-Murata-Electronics-LQM21DH470M70L_C2046325.html
footprint IND-0805 (0805 (2012M) Inductor)
pins: 1, 2

## LQM21DN100N00D
designator L?  Inductance: 10uH
Inductor, 10uH, ±30%, 500mΩ, 15mA, SMD 0805; Manufacturer: Murata Electronics; Manufacturer Part Number: LQM21DN100N00D; Self-Resonant Frequency: 24MHz; Package Size: 0805; JLCPCB Basic Part: No; JLCPCB Part Number: C437350; Supplier 1: LCSC; Category: Inductors; Supplier Part Number 1: C437350; Tolerance: ±30%; Rated Current: 15mA; DC Resistance: 500mΩ; RoHS: Yes; ComponentLink1Description: Datasheet; ComponentLink1URL: https://wmsc.lcsc.com/wmsc/upload/file/pdf/v2/lcsc/2304140030_Murata-Electronics-LQM21DN100N00D_C437350.pdf; ComponentLink2Description: JLCPCB Part URL; ComponentLink2URL: https://jlcpcb.com/partdetail/C437350; ComponentLink3Description: LCSC Part URL; ComponentLink3URL: https://lcsc.com/product-detail/Inductors-SMD_Murata-Electronics-Murata-Electronics-LQM21DN100N00D_C437350.html
footprint IND-0805 (0805 (2012M) Inductor)
pins: 1, 2

## LQM21DN101M70L
designator L?  Inductance: 100uH
Inductor, 100uH, ±20%, 3.15Ω, 20mA, SMD 0805; Manufacturer: Murata Electronics; Manufacturer Part Number: LQM21DN101M70L; Self-Resonant Frequency: 8MHz; Package Size: 0805; JLCPCB Basic Part: No; JLCPCB Part Number: C1512138; Supplier 1: LCSC; Category: Inductors; Supplier Part Number 1: C1512138; Tolerance: ±20%; Rated Current: 20mA; Saturation Current: 20mA; DC Resistance: 3.15Ω; RoHS: Yes; ComponentLink1Description: Datasheet; ComponentLink1URL: https://wmsc.lcsc.com/wmsc/upload/file/pdf/v2/lcsc/2304140030_Murata-Electronics-LQM21DN101M70L_C1512138.pdf; ComponentLink2Description: JLCPCB Part URL; ComponentLink2URL: https://jlcpcb.com/partdetail/C1512138; ComponentLink3Description: LCSC Part URL; ComponentLink3URL: https://lcsc.com/product-detail/Inductors-SMD_Murata-Electronics-Murata-Electronics-LQM21DN101M70L_C1512138.html
footprint IND-0805 (0805 (2012M) Inductor)
pins: 1, 2

## LQM21DN470N00L
designator L?  Inductance: 47uH
Inductor, 47uH, ±30%, 1.2Ω, 7mA, SMD 0805; Manufacturer: Murata Electronics; Manufacturer Part Number: LQM21DN470N00L; Self-Resonant Frequency: 7.5MHz; Package Size: 0805; JLCPCB Basic Part: No; JLCPCB Part Number: C882483; Supplier 1: LCSC; Category: Inductors; Supplier Part Number 1: C882483; Tolerance: ±30%; Rated Current: 7mA; DC Resistance: 1.2Ω; RoHS: Yes; ComponentLink1Description: Datasheet; ComponentLink1URL: https://wmsc.lcsc.com/wmsc/upload/file/pdf/v2/lcsc/2201242130_Murata-Electronics-LQM21DN470N00L_C882483.pdf; ComponentLink2Description: JLCPCB Part URL; ComponentLink2URL: https://jlcpcb.com/partdetail/C882483; ComponentLink3Description: LCSC Part URL; ComponentLink3URL: https://lcsc.com/product-detail/Inductors-SMD_Murata-Electronics-Murata-Electronics-LQM21DN470N00L_C882483.html
footprint IND-0805 (0805 (2012M) Inductor)
pins: 1, 2

## LQM21FN1R0N00D
designator L?  Inductance: 1uH
Inductor, 1uH, ±30%, 260mΩ, 220mA, SMD 0805; Manufacturer: Murata Electronics; Manufacturer Part Number: LQM21FN1R0N00D; Package Size: 0805; JLCPCB Basic Part: No; JLCPCB Part Number: C86086; Supplier 1: LCSC; Category: Inductors; Supplier Part Number 1: C86086; Tolerance: ±30%; Rated Current: 220mA; Saturation Current: 220mA; DC Resistance: 260mΩ; RoHS: Yes; ComponentLink1Description: Datasheet; ComponentLink1URL: https://wmsc.lcsc.com/wmsc/upload/file/pdf/v2/lcsc/2304140030_Murata-Electronics-LQM21FN1R0N00D_C86086.pdf; ComponentLink2Description: JLCPCB Part URL; ComponentLink2URL: https://jlcpcb.com/partdetail/C86086; ComponentLink3Description: LCSC Part URL; ComponentLink3URL: https://lcsc.com/product-detail/Inductors-SMD_Murata-Electronics-Murata-Electronics-LQM21FN1R0N00D_C86086.html
footprint IND-0805 (0805 (2012M) Inductor)
pins: 1, 2

## LQM21FN2R2N00D
designator L?  Inductance: 2.2uH
Inductor, 2.2uH, ±30%, 364mΩ, 150mA, SMD 0805; Manufacturer: Murata Electronics; Manufacturer Part Number: LQM21FN2R2N00D; Self-Resonant Frequency: 1MHz; Package Size: 0805; JLCPCB Basic Part: No; JLCPCB Part Number: C113095; Supplier 1: LCSC; Category: Inductors; Supplier Part Number 1: C113095; Tolerance: ±30%; Rated Current: 150mA; Saturation Current: 150mA; DC Resistance: 364mΩ; RoHS: Yes; ComponentLink1Description: Datasheet; ComponentLink1URL: https://wmsc.lcsc.com/wmsc/upload/file/pdf/v2/lcsc/2304140030_Murata-Electronics-LQM21FN2R2N00D_C113095.pdf; ComponentLink2Description: JLCPCB Part URL; ComponentLink2URL: https://jlcpcb.com/partdetail/C113095; ComponentLink3Description: LCSC Part URL; ComponentLink3URL: https://lcsc.com/product-detail/Inductors-SMD_Murata-Electronics-Murata-Electronics-LQM21FN2R2N00D_C113095.html
footprint IND-0805 (0805 (2012M) Inductor)
pins: 1, 2
